# Altium footprint library PcbLib.PcbLib: 428 footprints (part 16 of 27)
Each footprint in its own frame and in the unit in brackets; x right, y up, seen from the top. Pads: shape width x height; smd on the part's side, far side on the other; paste and mask are expansions set on the pad; w line width, h text height; cw(c..) or ccw(c..) is an arc to the next point about the centre after c.
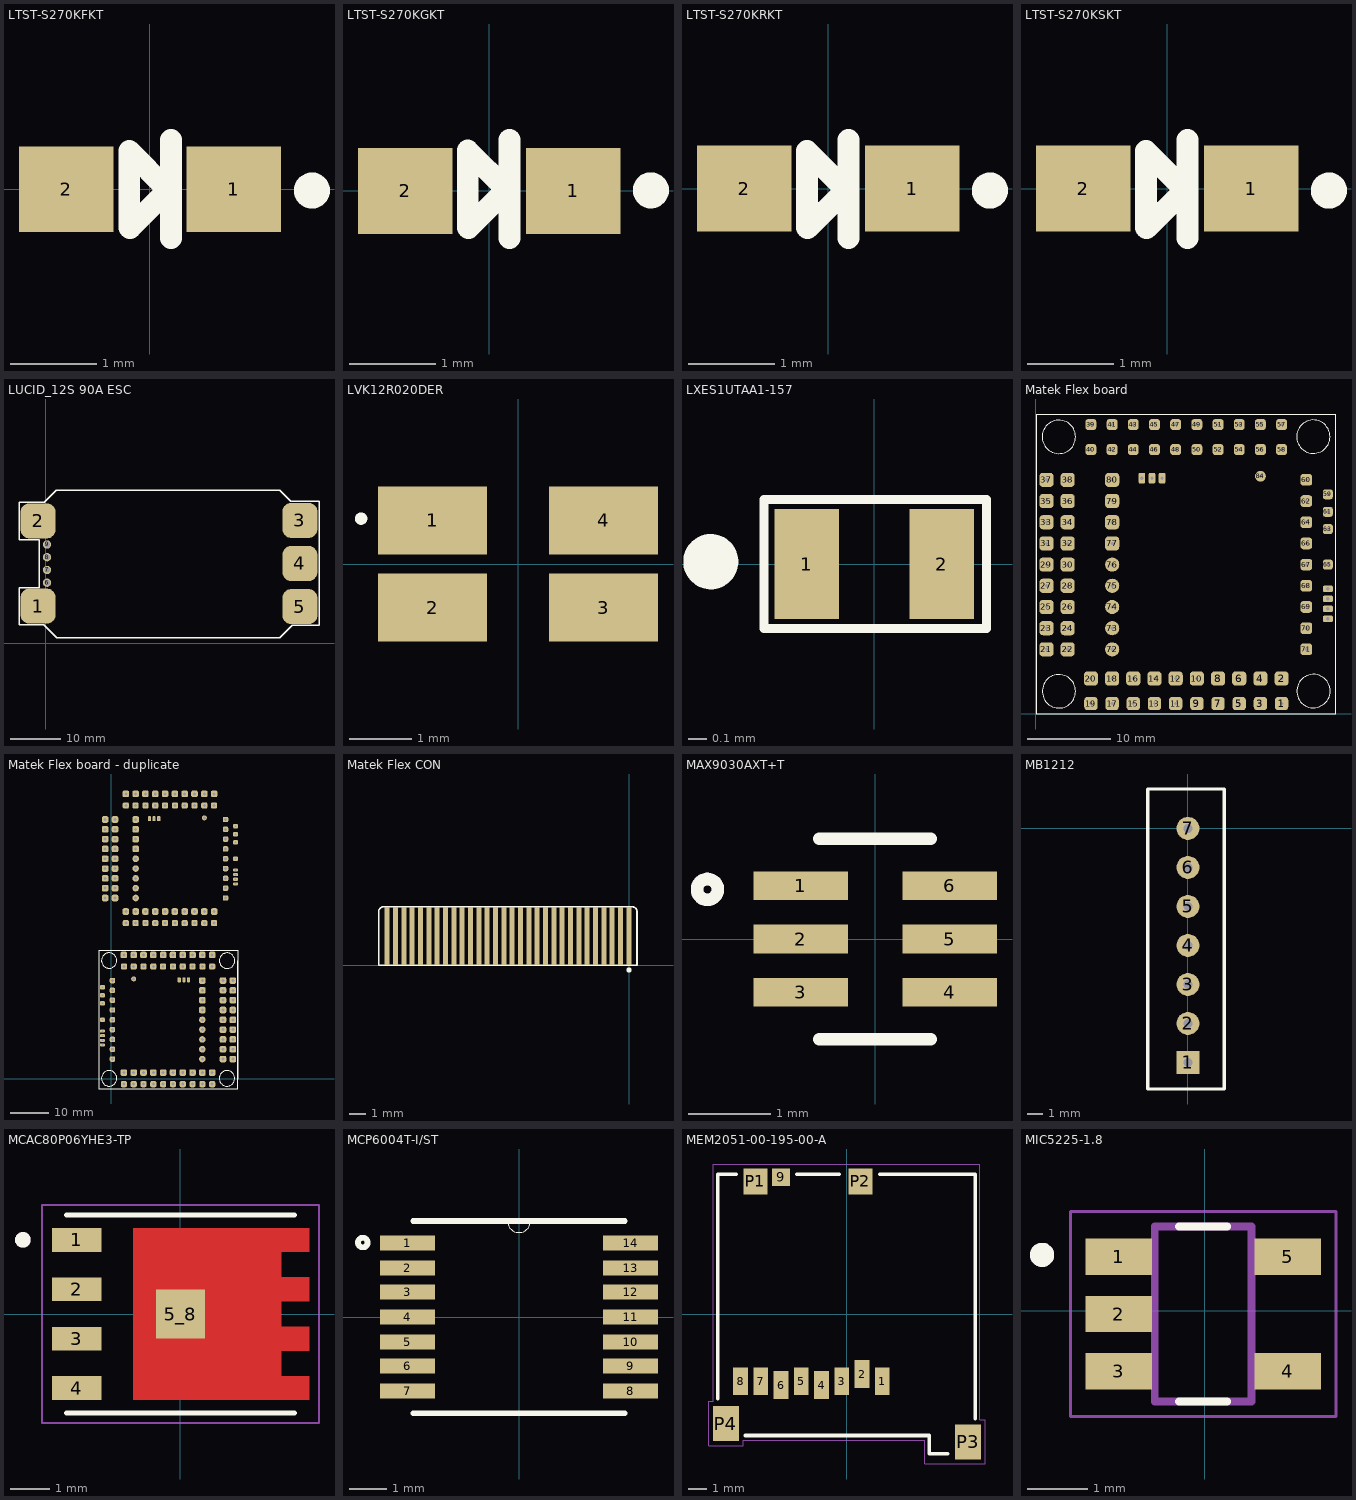
[diagram p15: the footprints below, top view; thin cyan lines are the x and y axes]

## LTST-S270KFKT [mm]
pads (2):
  rect 1.1x1 smd: 1(0.977,0) 2(-0.977,0)
Top Overlay:
  circle w0.254: c1.888,-0.014 r0.083
  lines w0.254: -0.241,-0.446 -0.241,0.447 ; -0.234,-0.453 0.209,-0.009 0.209,-0.003 -0.241,0.447 ; 0.245,-0.567 0.245,0.574 ; -0.241,0.447 -0.241,0.447
3D body "LTST-S270KGKT.STEP": height 0.63, standoff 0.03, extent -0.825,-0.762 0.825,0.388

## LTST-S270KGKT [mm]
pads (2):
  rect 1.1x1 smd: 1(0.977,0) 2(-0.977,0)
Top Overlay:
  circle w0.254: c1.878,0.008 r0.083
  lines w0.254: -0.251,-0.424 -0.251,0.47 ; -0.244,-0.43 0.199,0.013 0.199,0.019 -0.251,0.469 ; 0.235,-0.544 0.235,0.597 ; -0.251,0.469 -0.251,0.47
3D body "LTST-S270KGKT.STEP": height 0.63, standoff 0.03, extent -0.825,-0.762 0.825,0.388

## LTST-S270KRKT [mm]
pads (2):
  rect 1.1x1 smd: 1(0.977,0) 2(-0.977,0)
Top Overlay:
  circle w0.254: c1.88,-0.023 r0.083
  lines w0.254: -0.249,-0.455 -0.249,0.439 ; -0.242,-0.462 0.201,-0.018 0.201,-0.012 -0.249,0.438 ; 0.237,-0.576 0.237,0.566 ; -0.249,0.438 -0.249,0.439
3D body "LTST-S270KGKT.STEP": height 0.63, standoff 0.03, extent -0.825,-0.762 0.825,0.388

## LTST-S270KSKT [mm]
pads (2):
  rect 1.1x1 smd: 1(0.977,0) 2(-0.977,0)
Top Overlay:
  circle w0.254: c1.88,-0.023 r0.083
  lines w0.254: -0.249,-0.455 -0.249,0.439 ; -0.242,-0.462 0.201,-0.018 0.201,-0.012 -0.249,0.438 ; 0.237,-0.576 0.237,0.566 ; -0.249,0.438 -0.249,0.439
3D body "LTST-S270KGKT.STEP": height 0.63, standoff 0.03, extent -0.825,-0.762 0.825,0.388

## LUCID_12S 90A ESC [mm]
pads (9):
  rrect50% 7x7 all layers, no hole: 1(-1.5,7.4) 2(-1.5,24.4) 3(50.7,24.5) 4(50.7,15.9) 5(50.7,7.3)
  round 1.65 hole 1.1: 6(0.292,12.068) 7(0.292,14.608) 8(0.292,17.148) 9(0.292,19.688)
Top Overlay:
  lines w0.254: -5.3,3.7 -5.3,11.1 -1.3,11.1 -1.3,15.25 -1.3,16.15 -1.3,20.6 -5.3,20.6 -5.3,28.1 -0.3,28.1 2.1,30.5 46.7,30.5 48.9,28.3 54.5,28.3 54.5,22.7 54.5,3.6 49.2,3.6 46.7,1.1 2.2,1.1 -0.4,3.7 -5.3,3.7
Bottom Overlay:
  lines w0.254: 2.9,3.5 ccw(c3.3,3.5) 3.3,3.1 11.408,3.1 ccw(c11.408,3.492) 11.8,3.492 11.8,8.8 cw(c12.3,8.8) 12.3,9.3 46.6,9.3 ccw(c46.6,9.7) 47,9.7 47,29 ccw(c46.6,29) 46.6,29.4 11,29.4 ccw(c11,29) 10.6,29 10.6,20.603 cw(c10.197,20.603) 10.197,20.2 4.908,20.2 ccw(c4.908,19.792) 4.5,19.792 4.5,14.3 cw(c4,14.3) 4,13.8 3.4,13.8 ccw(c3.4,13.3) 2.9,13.3 2.9,3.5
3D body "01pcb.PNG.step": height 5.46, standoff -1.93, extent -3.7,1.299 54.05,30.301

## LVK12R020DER [mm]
pads (4):
  rect 1.75x1.1 smd: 1(-1.375,0.7) 2(-1.375,-0.7) 3(1.375,-0.7) 4(1.375,0.7)
Top Overlay:
  lines w0.1: -2.525,0.68 ccw(c-2.525,0.73) -2.525,0.78 ccw(c-2.525,0.73) -2.525,0.68
3D body "LVK12R020DER.step": height 0.7, standoff 0, extent -1.59,-0.8 1.61,0.8

## LXES1UTAA1-157 [mm]
pads (2):
  rect 0.35x0.6 smd: 1(-0.368,0) 2(0.368,0)
Top Overlay:
  circle w0.15: c-0.889,0.013 r0.075
  lines w0.05: -0.6,-0.35 0.61,-0.35 0.61,0.35 -0.6,0.35 -0.6,-0.35
3D body "step_temp.STEP": height 0.45, standoff 0, extent -0.5,-0.3 0.5,0.3

## Matek Flex board [mm]
pads (88):
  rrect50% 1.6x1.6 hole 0.4 paste-0.041 mask+0.102: 1(29.448,1.25) 3(26.908,1.25) 5(24.368,1.25) 7(21.828,1.25) 9(19.288,1.25) 11(16.748,1.25) 13(14.208,1.25) 15(11.668,1.25) 17(9.128,1.25) 19(6.588,1.25)
  rrect50% 1.7x1.7 hole 0.4 paste-0.044 mask+0.102: 2(29.448,4.25) 4(26.908,4.25) 6(24.368,4.25) 8(21.828,4.25) 10(19.288,4.25) 12(16.748,4.25) 14(14.208,4.25) 16(11.668,4.25) 18(9.128,4.25) 20(6.588,4.25) 21(1.258,7.75) 22(3.798,7.75) 23(1.258,10.29) 24(3.798,10.29) 25(1.258,12.83) 26(3.798,12.83) 27(1.258,15.37) 28(3.798,15.37) 29(1.258,17.91) 30(3.798,17.91) 31(1.258,20.45) 32(3.798,20.45) 33(1.258,22.99) 34(3.798,22.99) 35(1.258,25.53) 36(3.798,25.53) 37(1.258,28.07) 38(3.798,28.07) 77(9.138,20.45) 78(9.138,22.99) 79(9.138,25.53) 80(9.138,28.07)
  rrect50% 1.3x1.3 / inner rrect50% 1.7x1.7 / far side rrect50% 1.7x1.7 hole 0.4 paste-0.033 mask+0.102: 39(6.588,34.7) 40(6.588,31.7) 41(9.128,34.7) 42(9.128,31.7) 43(11.668,34.7) 44(11.668,31.7) 45(14.208,34.7) 46(14.208,31.7) 47(16.748,34.7) 48(16.748,31.7) 49(19.288,34.7) 50(19.288,31.7) 51(21.828,34.7) 52(21.828,31.7) 53(24.368,34.7) 54(24.368,31.7) 55(26.908,34.7) 56(26.908,31.7) 57(29.448,34.7) 58(29.448,31.7)
  rrect50% 1.2x1.2 hole 0.4 paste-0.031 mask+0.102: 59(34.988,26.34) 61(34.988,24.24) 63(34.988,22.16) 65(34.988,17.91)
  rrect50% 1.4x1.4 hole 0.4 paste-0.036 mask+0.102: 60(32.408,28.07) 62(32.408,25.53) 64(32.408,22.99) 66(32.408,20.45) 67(32.408,17.91) 68(32.408,15.37) 69(32.408,12.83) 70(32.408,10.29) 71(32.408,7.75)
  round 1.7 hole 0.4 paste-0.044 mask+0.102: 72(9.138,7.75) 73(9.138,10.29) 74(9.138,12.83) 75(9.138,15.37) 76(9.138,17.91)
  rrect50% 0.8x1.3 hole 0.4 paste-0.026 mask+0.102: 81(12.698,28.27) 82(13.908,28.27) 83(15.118,28.27)
  round 1.3 hole 0.4 paste-0.033 mask+0.102: 84(26.918,28.5)
  rrect50% 1.2x0.8 hole 0.4 paste-0.025 mask+0.102: 85(34.988,15) 86(34.988,13.8) 87(34.988,12.6) 88(34.988,11.4)
Top Overlay:
  circle w0.127: c33.27,2.75 r2
  circle w0.127: c2.754,2.72 r2
  circle w0.127: c33.254,33.25 r2
  circle w0.127: c2.748,33.222 r2
  lines w0.127: 0.004,35.96 0.004,0 35.97,0 35.97,35.965 0.01,35.965
3D body "H743-slim_STEP.step": height 6.1, standoff 0.2, extent 0,-0.03 36.645,35.97

## Matek Flex board - duplicate [mm]
pads (176):
  rrect50% 1.6x1.6 hole 0.762 paste-0.041 mask+0.102: 1(3.25,-1.35) 1(26.608,40.34) 3(5.79,-1.35) 3(24.068,40.34) 5(8.33,-1.35) 5(21.528,40.34) 7(10.87,-1.35) 7(18.988,40.34) 9(13.41,-1.35) 9(16.448,40.34) 11(13.908,40.34) 11(15.95,-1.35) 13(11.368,40.34) 13(18.49,-1.35) 15(8.828,40.34) 15(21.03,-1.35) 17(6.288,40.34) 17(23.57,-1.35) 19(3.748,40.34) 19(26.11,-1.35) 40(3.748,70.79) 40(26.11,29.1) 42(6.288,70.79) 42(23.57,29.1) 44(8.828,70.79) 44(21.03,29.1) 46(11.368,70.79) 46(18.49,29.1) 48(13.908,70.79) 48(15.95,29.1) 50(13.41,29.1) 50(16.448,70.79) 52(10.87,29.1) 52(18.988,70.79) 54(8.33,29.1) 54(21.528,70.79) 56(5.79,29.1) 56(24.068,70.79) 58(3.25,29.1) 58(26.608,70.79)
  rrect50% 1.7x1.7 hole 0.762 paste-0.044 mask+0.102: 2(3.25,1.65) 2(26.608,43.34) 4(5.79,1.65) 4(24.068,43.34) 6(8.33,1.65) 6(21.528,43.34) 8(10.87,1.65) 8(18.988,43.34) 10(13.41,1.65) 10(16.448,43.34) 12(13.908,43.34) 12(15.95,1.65) 14(11.368,43.34) 14(18.49,1.65) 16(8.828,43.34) 16(21.03,1.65) 18(6.288,43.34) 18(23.57,1.65) 20(3.748,43.34) 20(26.11,1.65) 21(-1.582,46.84) 21(31.44,5.15) 22(0.958,46.84) 22(28.9,5.15) 23(-1.582,49.38) 23(31.44,7.69) 24(0.958,49.38) 24(28.9,7.69) 25(-1.582,51.92) 25(31.44,10.23) 26(0.958,51.92) 26(28.9,10.23) 27(-1.582,54.46) 27(31.44,12.77) 28(0.958,54.46) 28(28.9,12.77) 29(-1.582,57) 29(31.44,15.31) 30(0.958,57) 30(28.9,15.31) 31(-1.582,59.54) 31(31.44,17.85) 32(0.958,59.54) 32(28.9,17.85) 33(-1.582,62.08) 33(31.44,20.39) 34(0.958,62.08) 34(28.9,20.39) 35(-1.582,64.62) 35(31.44,22.93) 36(0.958,64.62) 36(28.9,22.93) 37(-1.582,67.16) 37(31.44,25.47) 38(0.958,67.16) 38(28.9,25.47) 39(3.748,73.79) 39(26.11,32.1) 41(6.288,73.79) 41(23.57,32.1) 43(8.828,73.79) 43(21.03,32.1) 45(11.368,73.79) 45(18.49,32.1) 47(13.908,73.79) 47(15.95,32.1) 49(13.41,32.1) 49(16.448,73.79) 51(10.87,32.1) 51(18.988,73.79) 53(8.33,32.1) 53(21.528,73.79) 55(5.79,32.1) 55(24.068,73.79) 57(3.25,32.1) 57(26.608,73.79) 77(6.298,59.54) 77(23.56,17.85) 78(6.298,62.08) 78(23.56,20.39) 79(6.298,64.62) 79(23.56,22.93) 80(6.298,67.16) 80(23.56,25.47)
  rrect50% 1.2x1.2 hole 0.4 paste-0.031 mask+0.102: 59(-2.29,23.74) 59(32.148,65.43) 61(-2.29,21.64) 61(32.148,63.33) 63(-2.29,19.56) 63(32.148,61.25) 65(-2.29,15.31) 65(32.148,57)
  rrect50% 1.4x1.4 hole 0.762 paste-0.036 mask+0.102: 60(0.29,25.47) 60(29.568,67.16) 62(0.29,22.93) 62(29.568,64.62) 64(0.29,20.39) 64(29.568,62.08) 66(0.29,17.85) 66(29.568,59.54) 67(0.29,15.31) 67(29.568,57) 68(0.29,12.77) 68(29.568,54.46) 69(0.29,10.23) 69(29.568,51.92) 70(0.29,7.69) 70(29.568,49.38) 71(0.29,5.15) 71(29.568,46.84)
  round 1.7 hole 0.762 paste-0.044 mask+0.102: 72(6.298,46.84) 72(23.56,5.15) 73(6.298,49.38) 73(23.56,7.69) 74(6.298,51.92) 74(23.56,10.23) 75(6.298,54.46) 75(23.56,12.77) 76(6.298,57) 76(23.56,15.31)
  rrect50% 0.8x1.3 hole 0.4 paste-0.026 mask+0.102: 81(9.858,67.36) 81(20,25.67) 82(11.068,67.36) 82(18.79,25.67) 83(12.278,67.36) 83(17.58,25.67)
  round 1.3 hole 0.762 paste-0.033 mask+0.102: 84(5.78,25.9) 84(24.078,67.59)
  rrect50% 1.2x0.8 hole 0.4 paste-0.025 mask+0.102: 85(-2.29,12.4) 85(32.148,54.09) 86(-2.29,11.2) 86(32.148,52.89) 87(-2.29,10) 87(32.148,51.69) 88(-2.29,8.8) 88(32.148,50.49)
Top Overlay:
  circle w0.127: c29.95,30.622 r2
  circle w0.127: c29.944,0.15 r2
  circle w0.127: c-0.572,0.15 r2
  circle w0.127: c-0.556,30.65 r2
  lines w0.127: 32.688,33.366 -0.506,33.366 -3.272,33.366 -3.272,-2.6 -0.173,-2.6 32.694,-2.6 32.694,30.616 ; 32.694,-0.134 32.694,33.366
Bottom Overlay:
  circle w0.127: c-0.092,72.312 r2
  circle w0.127: c-0.086,41.84 r2
  circle w0.127: c30.43,41.84 r2
  circle w0.127: c30.414,72.34 r2
  lines w0.127: -2.836,41.556 -2.836,75.055 ; -2.836,72.306 -2.836,39.09 30.03,39.09 33.13,39.09 33.13,75.055 30.364,75.055 -2.83,75.055
3D body "H743-slim_STEP.step": height 5.4, standoff -0.5, extent -3.95,-2.6 32.695,33.4
3D body "H743-slim_STEP.step": height 5.4, standoff -0.5, extent -2.837,39.09 33.808,75.09

## Matek Flex CON [mm]
pads (30):
  rect 0.3x3.5 smd: 1(-0.01,1.753) 2(-0.51,1.753) 3(-1.01,1.753) 4(-1.51,1.753) 5(-2.01,1.753) 6(-2.51,1.753) 7(-3.01,1.753) 8(-3.51,1.753) 9(-4.01,1.753) 10(-4.51,1.753) 11(-5.01,1.753) 12(-5.51,1.753) 13(-6.01,1.753) 14(-6.51,1.753) 15(-7.01,1.753) 16(-7.51,1.753) 17(-8.01,1.753) 18(-8.51,1.753) 19(-9.01,1.753) 20(-9.51,1.753) 21(-10.01,1.753) 22(-10.51,1.753) 23(-11.01,1.753) 24(-11.51,1.753) 25(-12.01,1.753) 26(-12.51,1.753) 27(-13.01,1.753) 28(-13.51,1.753) 29(-14.01,1.753) 30(-14.51,1.753)
Top Overlay:
  circle w0.15: c0,-0.292 r0.075
  lines w0.1: -15.02,0 -15.02,3.205 cw(c-14.719,3.205) -14.719,3.506 0.184,3.506 cw(c0.184,3.207) 0.483,3.207 0.483,0 -15.02,0

## MAX9030AXT+T [mm]
pads (6):
  rect 1.15x0.35 smd: 1(-0.905,0.65) 2(-0.905,0) 3(-0.905,-0.65) 4(0.91,-0.65) 5(0.91,0) 6(0.91,0.65)
Top Overlay:
  lines w0.152: -0.68,-1.219 0.68,-1.219 ; -0.68,1.219 0.68,1.219 ; -2.044,0.477 cw(c-2.044,0.604) -2.044,0.731 cw(c-2.044,0.604) -2.044,0.477
Mechanical 13:
  lines w0.152: -2.044,0.477 cw(c-2.044,0.604) -2.044,0.731 cw(c-2.044,0.604) -2.044,0.477
3D body "step_temp.STEP": height 1.1, standoff 0, extent -1.05,-1 1.05,1

## MB1212 [mm]
pads (7):
  rect 1.5x1.5 hole 0.6: 1(0.025,-15.24)
  round 1.5 hole 0.6: 2(0.025,-12.7) 3(0.025,-10.16) 4(0.025,-7.62) 5(0.025,-5.08) 6(0.025,-2.54) 7(0.025,0)
Top Overlay:
  lines w0.2: -2.591,-16.967 -2.591,2.565 2.388,2.565 2.388,-16.967 -2.591,-16.967
3D body: height 20, standoff 0.2, extent 3.258,-18.301 4.718,3.619
3D body: height 18.2, standoff 1.8, extent 4.623,-15.49 18.263,0.91
3D body: height 11, standoff 5, extent -5.994,-14.986 3.302,-8.776

## MCAC80P06YHE3-TP [mm]
height 1.2
pads (5):
  rect 1.27x0.61 smd: 1(-2.67,1.905) 2(-2.67,0.635) 3(-2.67,-0.635) 4(-2.67,-1.905)
  rect 1.27x1.27 smd paste-2 mask+0: 5_8(0,0)
Top Layer:
  region: 3.305,1.6 2.595,1.6 2.595,0.94 3.305,0.94 3.305,0.33 2.595,0.33 2.595,-0.33 3.305,-0.33 3.305,-0.94 2.595,-0.94 2.595,-1.6 3.305,-1.6 3.305,-2.21 -1.215,-2.21 -1.215,2.21 3.305,2.21
Top Overlay:
  circle w0.2: c-4.051,1.905 r0.1
  lines w0.127: -2.927,-2.55 2.927,-2.55 ; -2.927,2.55 2.927,2.55
Top Paste:
  region: 0.44,0.25 -0.71,0.25 -0.71,1.71 0.44,1.71
  region: 2.09,0.25 0.94,0.25 0.94,1.71 2.09,1.71
  region: 0.44,-1.71 -0.71,-1.71 -0.71,-0.25 0.44,-0.25
  region: 2.09,-1.71 0.94,-1.71 0.94,-0.25 2.09,-0.25
  region: 3.31,1.595 2.6,1.595 2.6,2.215 3.31,2.215
  region: 3.31,0.325 2.6,0.325 2.6,0.945 3.31,0.945
  region: 3.31,-0.945 2.6,-0.945 2.6,-0.325 3.31,-0.325
  region: 3.31,-2.215 2.6,-2.215 2.6,-1.595 3.31,-1.595
Top Solder:
  region: 3.405,1.5 2.695,1.5 2.695,1.04 3.405,1.04 3.405,0.23 2.695,0.23 2.695,-0.23 3.405,-0.23 3.405,-1.04 2.695,-1.04 2.695,-1.5 3.405,-1.5 3.405,-2.31 -1.315,-2.31 -1.315,2.31 3.405,2.31
Mechanical 13:
  circle w0.2: c-4.051,1.905 r0.1
Mechanical 15:
  lines w0.05: -3.555,-2.8 -3.555,2.8 3.56,2.8 3.56,-2.8 -3.555,-2.8
3D body "MCAC80P06YHE3-TP.stp": height 1.05, standoff 0.05, extent -3.1,-2.644 3.2,2.656

## MCP6004T-I/ST [mm]
pads (14):
  rect 1.45x0.4 smd: 1(-2.946,1.956) 2(-2.946,1.295) 3(-2.946,0.66) 4(-2.946,0) 5(-2.946,-0.66) 6(-2.946,-1.295) 7(-2.946,-1.956) 8(2.946,-1.956) 9(2.946,-1.295) 10(2.946,-0.66) 11(2.946,0) 12(2.946,0.66) 13(2.946,1.295) 14(2.946,1.956)
Top Overlay:
  lines w0: -0.305,2.54 ccw(c0,2.54) 0.305,2.54
  lines w0.152: -4.007,1.937 cw(c-4.13,1.97) -4.003,1.97 ; -2.794,-2.54 2.794,-2.54 ; -2.794,2.54 2.794,2.54
3D body "TSSOP14_MC_MCH.step": height 1.2, standoff 0, extent -3.2,-2.549 3.2,2.551

## MEM2051-00-195-00-A [mm]
pads (13):
  rect 0.8x1.5 smd: 1(1.94,-3.66) 2(0.84,-3.26) 3(-0.26,-3.66) 4(-1.36,-3.86) 5(-2.46,-3.66) 6(-3.56,-3.86) 7(-4.66,-3.66) 8(-5.76,-3.66)
  rect 1x0.95 smd: 9(-3.56,7.425)
  rect 1.3x1.4 smd: P1(-4.95,7.2) P2(0.75,7.2)
  rect 1.4x1.9 smd: P3(6.6,-6.95) P4(-6.55,-5.95)
Top Overlay:
  lines w0.2: -7,-4.6 -7,7.6 -6,7.6 ; -5.5,-6.6 4.5,-6.6 4.5,-7.6 5.5,-7.6 ; -2.7,7.6 -0.4,7.6 ; 1.8,7.6 7,7.6 7,-5.7
Mechanical 15:
  lines w0.05: -7.5,-7.15 -5.6,-7.15 -5.6,-6.85 4.25,-6.85 4.25,-8.15 7.55,-8.15 7.55,-5.75 7.25,-5.75 7.25,8.15 -7.25,8.15 -7.25,-4.75 -7.5,-4.75 -7.5,-7.15
3D body "step_temp.STEP": height 1.95, standoff 0, extent -7.05,-7.6 7.05,7.7

## MIC5225-1.8 [mm]
pads (5):
  rect 1.1x0.6 smd paste+0 mask+0.102: 1(-1.425,0.899) 2(-1.425,-0.051) 3(-1.425,-1.001) 4(1.375,-1.001) 5(1.375,0.899)
Top Overlay:
  circle w0.2: c-2.695,0.929 r0.1
  lines w0.127: -0.425,-1.501 0.375,-1.501 ; -0.425,1.399 0.375,1.399
Mechanical 13:
  circle w0.2: c-2.695,0.929 r0.1
  lines w0.127: -0.825,-1.501 0.775,-1.501 0.775,1.399 -0.825,1.399 -0.825,-1.501
Mechanical 15:
  lines w0.05: -2.225,-1.751 2.175,-1.751 2.175,1.649 -2.225,1.649 -2.225,-1.751